# Altium footprint library PCBLIB.PcbLib: 775 footprints (part 29 of 49)
Each footprint in its own frame and in the unit in brackets; x right, y up, seen from the top. Pads: shape width x height; smd on the part's side, far side on the other; paste and mask are expansions set on the pad; w line width, h text height; cw(c..) or ccw(c..) is an arc to the next point about the centre after c.
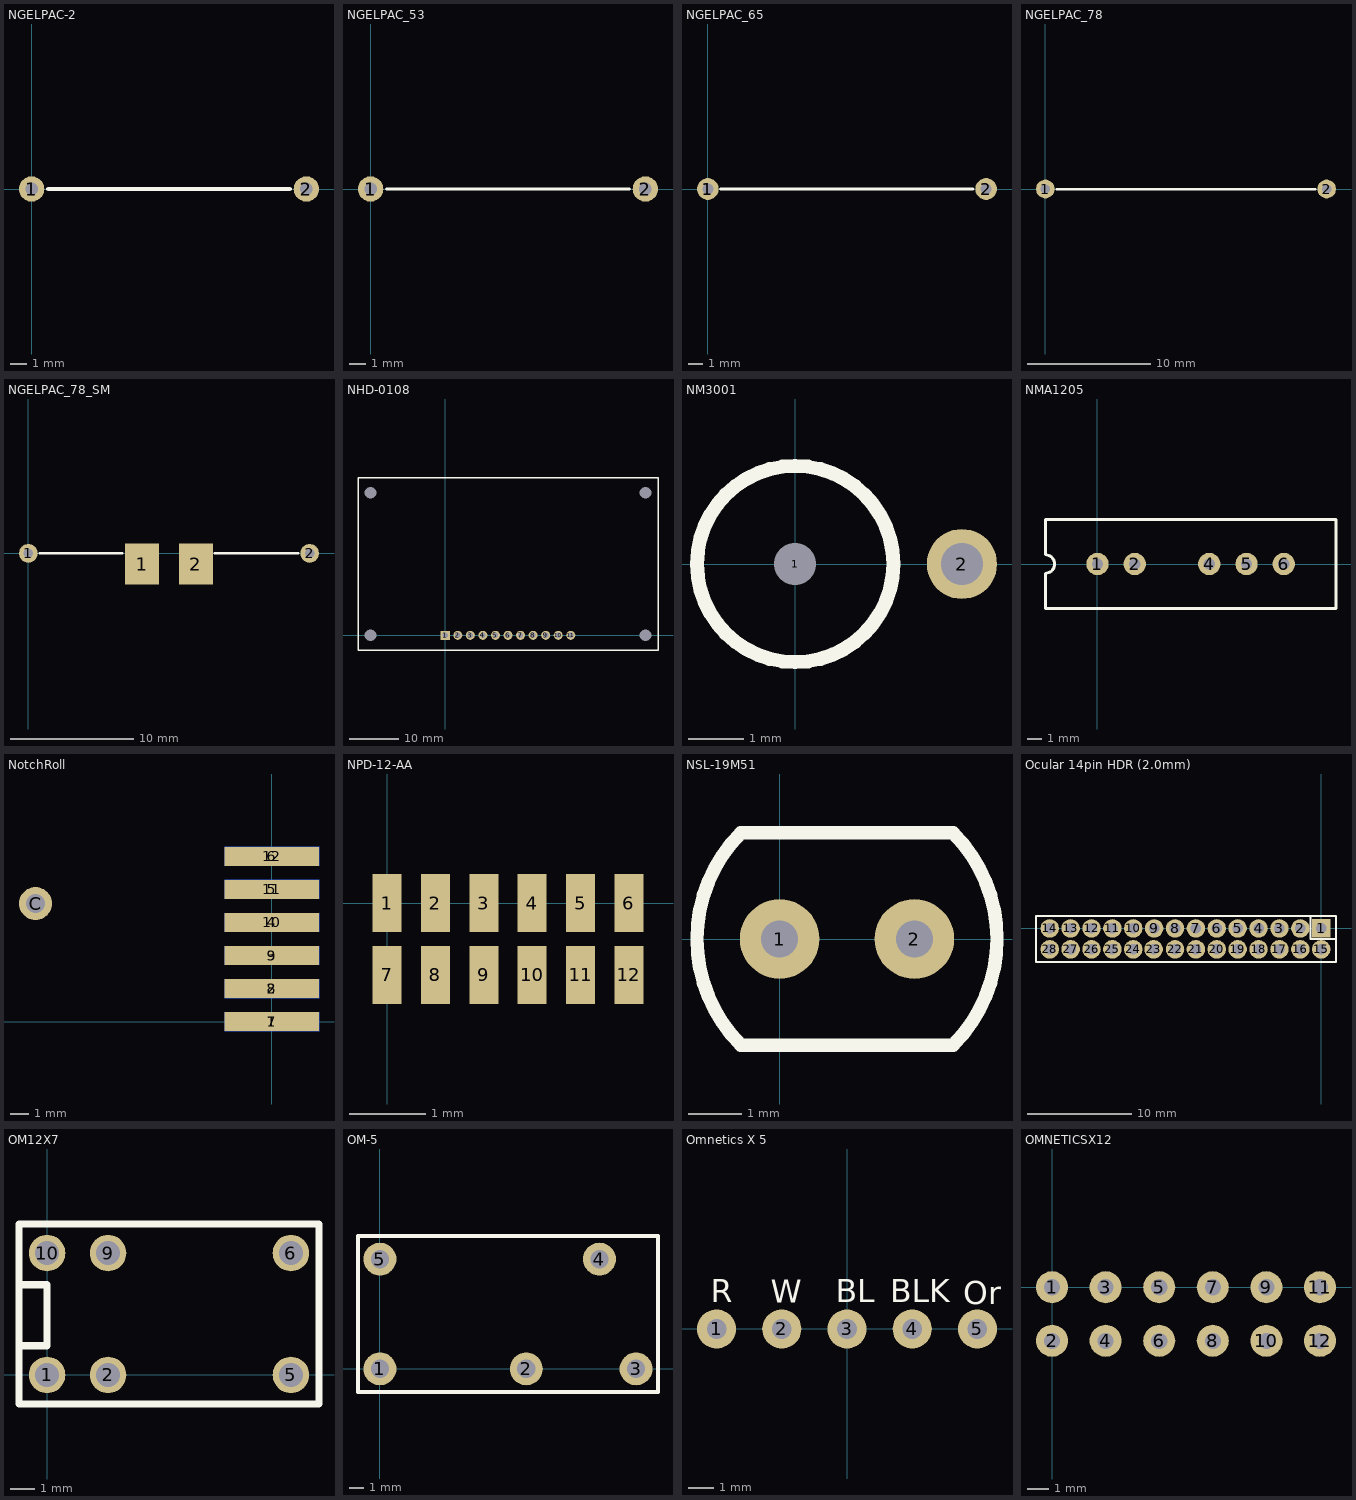
[diagram p28: the footprints below, top view; thin cyan lines are the x and y axes]

## NGELPAC-2 [mil]
height 310
pads (2):
  round 60 hole 30: 1(0,0) 2(650,0)
TopOverlay:
  lines w10: 39,0 611,0

## NGELPAC_53 [mil]
height 200
pads (2):
  round 60 hole 30: 1(0,0) 2(650,0)
TopOverlay:
  lines w8: 38,0 612,0

## NGELPAC_65 [mil]
height 50
pads (2):
  round 60 hole 30: 1(0,0) 2(770,0)
TopOverlay:
  lines w8: 35,0 734,0

## NGELPAC_78 [mil]
height 370
pads (2):
  round 60 hole 30: 1(0,0) 2(900,0)
TopOverlay:
  lines w8: 37,0 864,0

## NGELPAC_78_SM [mil]
height 370
pads (4):
  round 60 hole 30: 1(0,0) 2(900,0)
  rect 110x132 smd: 1(363.75,-34) 2(536.25,-34)
TopOverlay:
  lines w8: 36,0 300.97,0 ; 597.12,0 863,0

## NHD-0108 [mil] "Newhaven Display"
height 0.01
pads (15):
  rect 72x72 hole 42: 1(0,0)
  round 72 hole 42: 2(100,0) 3(200,0) 4(300,0) 5(400,0) 6(500,0) 7(600,0) 8(700,0) 9(800,0) 10(900,0) 11(1000,0)
  round 0 hole 94 unplated: MH(-596.46,0) MH(-596.46,1135.83) MH(1596.46,0) MH(1596.46,1135.83)
TopOverlay:
  lines w10: -694.88,-118.11 -694.88,1253.94 1694.88,1253.94 1694.88,-108.23 1694.88,-118.11 -694.88,-118.11
Mechanical4:
  text ".341" at 0,0 h1

## NM3001 [mil]
height 225
pads (2):
  round 10 / inner round 50 / far side round 50 hole 30: 1(0,0)
  round 50 hole 30: 2(119,0)
TopOverlay:
  circle w10: c0,0 r70

## NMA1205 [mil]
pads (5):
  round 60 hole 30: 1(0,0) 2(100,0) 4(300,0) 5(400,0) 6(500,0)
TopOverlay:
  lines w8: -140,-120 640,-120 640,120 -140,120 ; -139.69,119.69 -139.69,25 cw(c-140,0) -139.55,-25 -139.55,-119.55

## NotchRoll [mil]
pads (13):
  rect 200x40 smd: 1(0,0) 2(0,70) 3(0,140) 4(0,210) 5(0,280) 6(0,350)
  rect 200x40 smd far side: 7(0,0) 8(0,70) 9(0,140) 10(0,210) 11(0,280) 12(0,350)
  round 70 hole 40: C(-500,250)

## NPD-12-AA [mil] "Strip Connector Pad Layouts"
height 64
pads (12):
  rect 15x30 smd: 1(0,0) 2(25,0) 3(50,0) 4(75,0) 5(100,0) 6(125,0) 7(0,-37) 8(25,-37) 9(50,-37) 10(75,-37) 11(100,-37) 12(125,-37)

## NSL-19M51 [mm] "Photocell"
height 1.78
pads (2):
  round 1.5 hole 0.7: 1(0,0) 2(2.54,0)
TopOverlay:
  lines w0.254: -0.73,-2 cw(c1.27,0) -0.73,2 3.27,2 cw(c1.27,0) 3.27,-2 -0.73,-2

## Ocular 14pin HDR (2.0mm) [mil]
pads (28):
  rect 70x70 hole 40: 1(0,0)
  round 70 hole 40: 2(-79,0) 3(-158,0) 4(-237,0) 5(-316,0) 6(-395,0) 7(-474,0) 8(-553,0) 9(-632,0) 10(-711,0) 11(-790,0) 12(-869,0) 13(-948,0) 14(-1027,0) 15(0,-79) 16(-79,-79) 17(-158,-79) 18(-237,-79) 19(-316,-79) 20(-395,-79) 21(-474,-79) 22(-553,-79) 23(-634,-79) 24(-711,-79) 25(-790,-79) 26(-869,-79) 27(-948,-79) 28(-1027,-79)
TopOverlay:
  lines w8: -40,47 -40,-40 56,-40 ; -1079,-127 56,-127 56,47 -1079,47 -1079,-127

## OM12X7 [mil]
pads (6):
  round 60 hole 39.76: 1(0,0) 2(100,0) 5(400,0) 6(400,200) 9(100,200) 10(0,200)
TopOverlay:
  lines w12: -46.06,47.87 0,47.87 0,147.87 -46.06,147.87 ; -46.06,-47.64 446.06,-47.64 446.06,247.64 -46.06,247.64 -46.06,-47.64
Mechanical4:
  text ".410" at 0,200 h1
  text ".410" at 0,0 h1

## OM-5 [mil]
pads (5):
  round 90 hole 50: 1(0,0) 2(400,0) 3(700,0) 4(600,300) 5(0,300)
TopOverlay:
  lines w10: -60,-63 760,-63 760,363 -60,363 -60,-63

## Omnetics X 5 [mil]
height 10
pads (5):
  round 60 hole 30: 1(-200,0) 2(-100,0) 3(0,0) 4(100,0) 5(200,0)
TopOverlay:
  text "Or" at 178,38 h35
  text "BLK" at 66,41 h35
  text "BL" at -17,41 h35
  text "W" at -117,40 h35
  text "R" at -209,41 h35

## OMNETICSX12 [mil]
pads (12):
  round 60 hole 30: 1(0,0) 2(0,-100) 3(100,0) 4(100,-100) 5(200,0) 6(200,-100) 7(300,0) 8(300,-100) 9(400,0) 10(400,-100) 11(500,0) 12(500,-100)